# Altium footprint library chipfc_libs.PCBLIB: 391 footprints (part 23 of 25)
Each footprint in its own frame and in the unit in brackets; x right, y up, seen from the top. Pads: shape width x height; smd on the part's side, far side on the other; paste and mask are expansions set on the pad; w line width, h text height; cw(c..) or ccw(c..) is an arc to the next point about the centre after c.
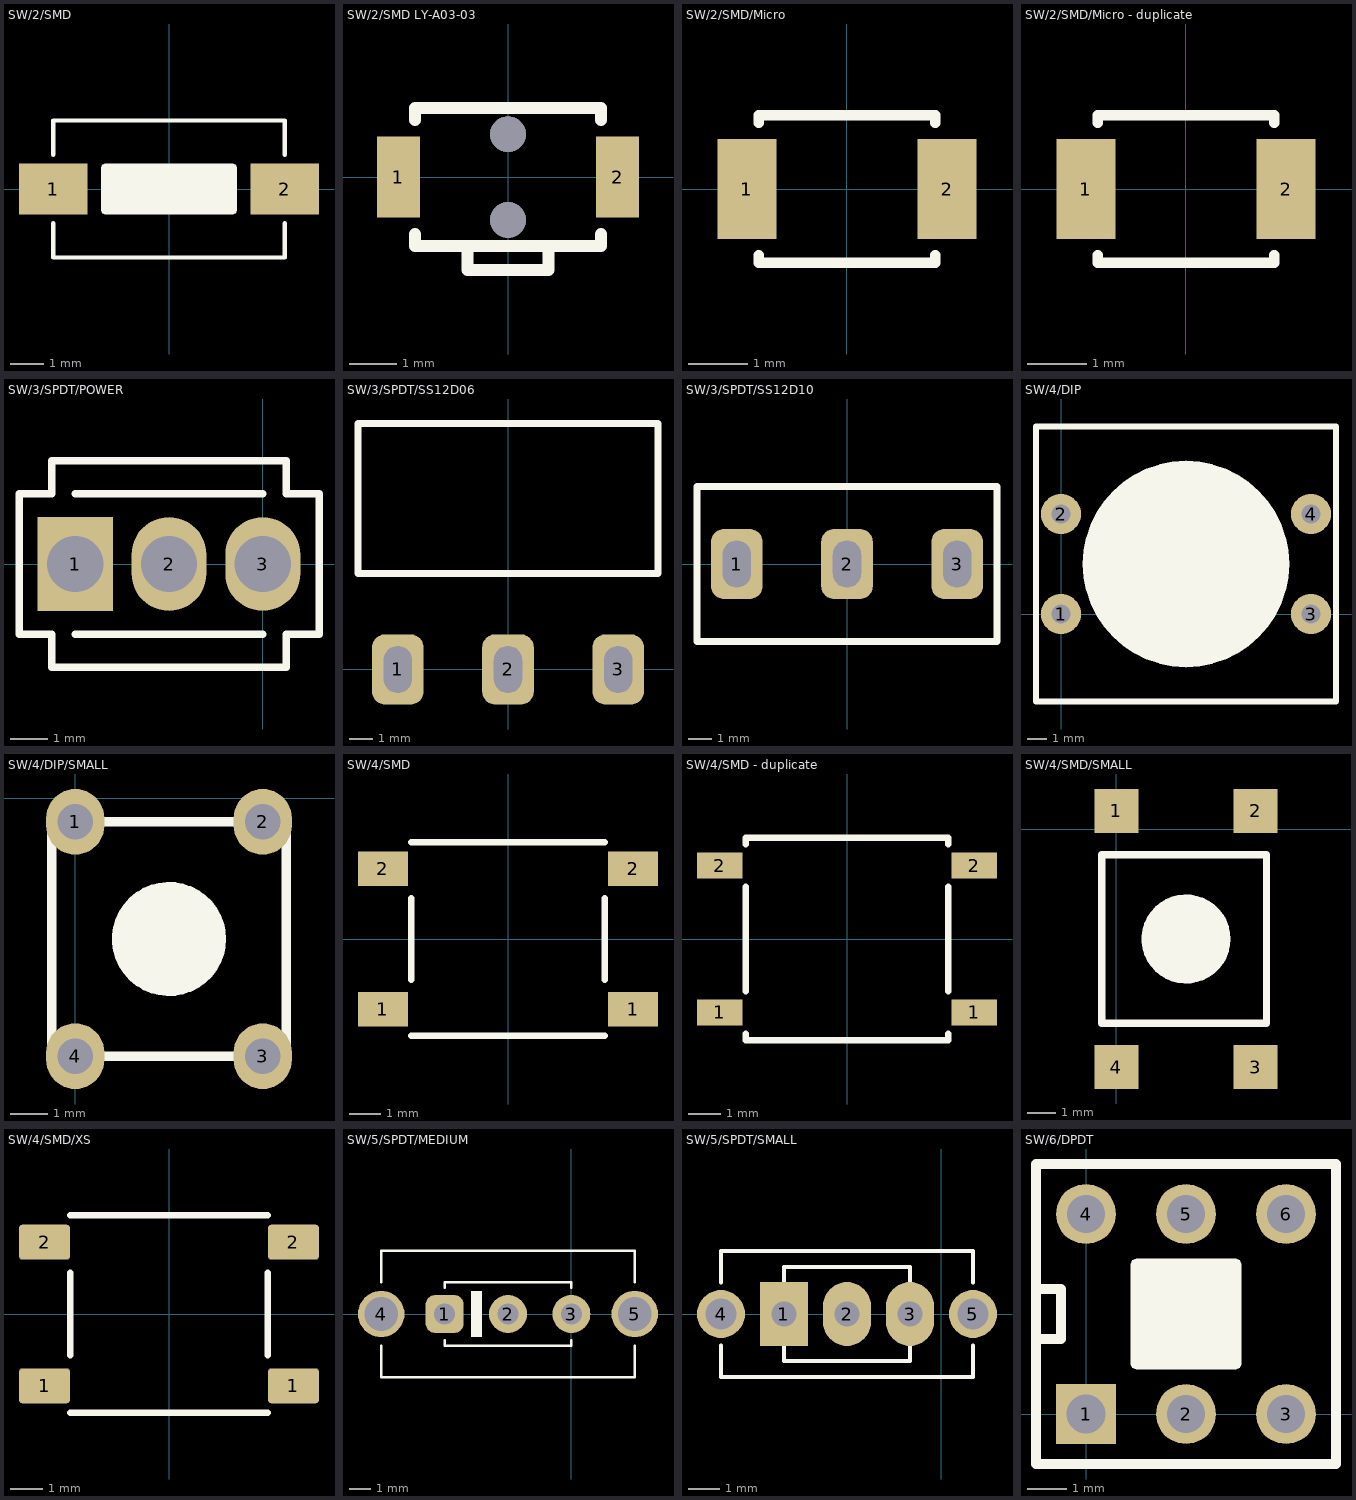
[diagram p22: the footprints below, top view; thin cyan lines are the x and y axes]

## SW/2/SMD [mil]
pads (2):
  rect 80x60 smd: 1(-135,0) 2(135,0)
Top Overlay:
  region: 78.06,28.06 79.33,25 79.33,-25 78.06,-28.06 75,-29.33 -75,-29.33 -78.06,-28.06 -79.33,-25 -79.33,25 -78.06,28.06 -75,29.33 75,29.33
  lines w5: -135,-40 -135,-80 135,-80 135,-40 ; -135,40 -135,80 135,80 135,40
3D body "User Library-TVBU19.step": height 98.43, standoff 0, extent -120,-72.83 120.16,72.83

## SW/2/SMD LY-A03-03 [mm]
pads (4):
  rect 0.9x1.7 smd: 1(-2.3,0) 2(2.3,0)
  round 0.75 hole 0.75: ""(0,-0.9) ""(0,0.9)
Top Overlay:
  lines w0.254: -1.95,-1.2 -1.95,-1.45 1.95,-1.45 1.95,-1.2 ; -1.95,1.2 -1.95,1.45 1.95,1.45 1.95,1.2 ; -0.85,-1.45 -0.85,-1.95 0.85,-1.95 0.85,-1.45

## SW/2/SMD/Micro [mm]
pads (2):
  rect 1x1.7 smd: 1(-1.7,0) 2(1.7,0)
Top Overlay:
  lines w0.178: -1.5,-1.125 -1.5,-1.25 1.5,-1.25 1.5,-1.125 ; -1.5,1.125 -1.5,1.25 1.5,1.25 1.5,1.125
3D body: height 1.6, standoff 0, extent -0.744,-0.748 0.75,0.749
3D body: height 1.2, standoff 0, extent -1.5,-1.25 1.5,1.25

## SW/2/SMD/Micro - duplicate [mm]
pads (2):
  rect 1x1.7 smd: 1(-1.7,0) 2(1.7,0)
Top Overlay:
  lines w0.178: -1.5,-1.125 -1.5,-1.25 1.5,-1.25 1.5,-1.125 ; -1.5,1.125 -1.5,1.25 1.5,1.25 1.5,1.125
3D body: height 1.6, standoff 0, extent -0.744,-0.748 0.75,0.749
3D body: height 1.2, standoff 0, extent -1.5,-1.25 1.5,1.25

## SW/3/SPDT/POWER [mil]
pads (3):
  rect 80x100 hole 60: 1(-200,0)
  oval 80x100 hole 60: 2(-100,0) 3(0,0)
Top Overlay:
  lines w8: -200,-75 0,-75 ; -200,75 0,75 ; -260,-75 -225,-75 -225,-110 25,-110 25,-75 60,-75 60,75 25,75 25,110 -225,110 -225,75 -260,75 -260,-75

## SW/3/SPDT/SS12D06 [mm]
pads (3):
  rrect50% 2.2x3 hole 1.2 slot 2 at 90 deg: 1(-4.7,0) 2(0,0) 3(4.7,0)
Top Overlay:
  lines w0.3: -6.4,4.1 6.4,4.1 6.4,10.5 -6.4,10.5 -6.4,4.1
3D body "ss-12d06l5r.stp": height 6.6, standoff -2.55, extent -6.475,-0.6 6.475,15.5

## SW/3/SPDT/SS12D10 [mm]
pads (3):
  rrect50% 2.2x3 hole 1.2 slot 2 at 90 deg: 1(-4.7,0) 2(0,0) 3(4.7,0)
Top Overlay:
  lines w0.3: -6.4,-3.3 6.4,-3.3 6.4,3.3 -6.4,3.3 -6.4,-3.3
3D body "41893.stp": height 12.5, standoff -5.4, extent -6.4,-3.3 6.35,3.8

## SW/4/DIP [mil]
pads (4):
  round 80 / inner round 62 / far side round 80 hole 38: 1(0,0) 2(0,200) 3(500,0) 4(500,200)
Top Overlay:
  drawing of 6 lines, arcs and shapes, not listed

## SW/4/DIP/SMALL [mil]
pads (4):
  oval 62x70 / inner round 60 / far side oval 62x70 hole 38: 1(0,-25) 2(200,-25) 3(200,-275) 4(0,-275)
Top Overlay:
  circle w10: c100,-150 r55.9
  region: 114.66,-95 114.73,-95.04 114.8,-95.04 128.4,-100.67 128.45,-100.72 128.52,-100.74 140.2,-109.7 140.24,-109.76 140.3,-109.8 149.26,-121.48 149.28,-121.55 149.33,-121.6 154.96,-135.2 154.96,-135.27 155,-135.34 156.92,-149.93 156.9,-150 156.92,-150.07 155,-164.66 154.96,-164.73 154.96,-164.8 149.33,-178.4 149.28,-178.45 149.26,-178.52 140.3,-190.2 140.24,-190.24 140.2,-190.3 128.52,-199.26 128.45,-199.28 128.4,-199.33 114.8,-204.96 114.73,-204.96 114.66,-205 100.07,-206.92 100,-206.9 99.93,-206.92 85.34,-205 85.27,-204.96 85.2,-204.96 71.6,-199.33 71.55,-199.28 71.48,-199.26 59.8,-190.3 59.76,-190.24 59.7,-190.2 50.74,-178.52 50.72,-178.45 50.67,-178.4 45.04,-164.8 45.04,-164.73 45,-164.66 43.08,-150.07 43.1,-150 43.08,-149.93 45,-135.34 45.04,-135.27 45.04,-135.2 49.37,-124.73 49.39,-124.72 49.39,-124.69 49.53,-124.57 49.67,-124.44 49.68,-124.44 49.77,-124.26 49.75,-124.24 49.75,-124.21 49.73,-124.19 49.75,-124.01 49.75,-123.82 50.67,-121.6 50.72,-121.55 50.74,-121.48 59.7,-109.8 59.76,-109.76 59.8,-109.7 71.48,-100.74 71.55,-100.72 71.6,-100.67 85.2,-95.04 85.27,-95.04 85.34,-95 99.93,-93.08 100,-93.1 100.07,-93.08
  lines w10: -25,-275 225,-275 225,-25 -25,-25 -25,-275

## SW/4/SMD [mm]
pads (4):
  rect 1.6x1.1 smd: 1(-4,-2.25) 1(4,-2.25) 2(-4,2.25) 2(4,2.25)
Top Overlay:
  lines w0.203: -3.1,-3.1 3.1,-3.1 ; -3.1,-1.3 -3.1,1.3 ; -3.1,3.1 3.1,3.1 ; 3.1,-1.3 3.1,1.3
3D body "User Library-PTS645SL70SMTR92-LFS.STEP": height 7, standoff 0, extent -4.5,-3 4.5,3

## SW/4/SMD - duplicate [mm]
pads (4):
  rect 1.4x0.8 smd: 1(-3.9,-2.25) 1(3.9,-2.25) 2(-3.9,2.25) 2(3.9,2.25)
Top Overlay:
  lines w0.203: -3.1,-2.9 -3.1,-3.1 3.1,-3.1 3.1,-2.9 ; -3.1,-1.6 -3.1,1.6 ; -3.1,2.9 -3.1,3.1 3.1,3.1 3.1,2.9 ; 3.1,-1.6 3.1,1.6
3D body "User Library-PTS645SL70SMTR92-LFS.STEP": height 7, standoff 0, extent -4.5,-3 4.5,3

## SW/4/SMD/SMALL [mil]
pads (4):
  rect 60x60 smd: 1(0,25) 2(190,25) 3(190,-325) 4(0,-325)
Top Overlay:
  circle w10: c95,-150 r55.9
  region: 109.66,-95 109.73,-95.04 109.8,-95.04 123.4,-100.67 123.45,-100.72 123.52,-100.74 135.2,-109.7 135.24,-109.76 135.3,-109.8 144.26,-121.48 144.28,-121.55 144.33,-121.6 149.96,-135.2 149.96,-135.27 150,-135.34 151.92,-149.93 151.9,-150 151.92,-150.07 150,-164.66 149.96,-164.73 149.96,-164.8 144.33,-178.4 144.28,-178.45 144.26,-178.52 135.3,-190.2 135.24,-190.24 135.2,-190.3 123.52,-199.26 123.45,-199.28 123.4,-199.33 109.8,-204.96 109.73,-204.96 109.66,-205 95.07,-206.92 95,-206.9 94.93,-206.92 80.34,-205 80.27,-204.96 80.2,-204.96 66.6,-199.33 66.55,-199.28 66.48,-199.26 54.8,-190.3 54.76,-190.24 54.7,-190.2 45.74,-178.52 45.72,-178.45 45.67,-178.4 40.04,-164.8 40.04,-164.73 40,-164.66 38.08,-150.07 38.1,-150 38.08,-149.93 40,-135.34 40.04,-135.27 40.04,-135.2 44.37,-124.73 44.39,-124.72 44.39,-124.69 44.53,-124.57 44.67,-124.44 44.68,-124.44 44.77,-124.26 44.75,-124.24 44.75,-124.21 44.73,-124.19 44.75,-124.01 44.75,-123.82 45.67,-121.6 45.72,-121.55 45.74,-121.48 54.7,-109.8 54.76,-109.76 54.8,-109.7 66.48,-100.74 66.55,-100.72 66.6,-100.67 80.2,-95.04 80.27,-95.04 80.34,-95 94.93,-93.08 95,-93.1 95.07,-93.08
  lines w10: -20,-265 205,-265 205,-35 -20,-35 -20,-265

## SW/4/SMD/XS [mm]
pads (4):
  rrect20% 1.6x1.1 smd: 1(-3.9,-2.25) 1(3.9,-2.25) 2(-3.9,2.25) 2(3.9,2.25)
Top Overlay:
  lines w0.203: -3.1,-3.1 3.1,-3.1 ; -3.1,-1.3 -3.1,1.3 ; -3.1,3.1 3.1,3.1 ; 3.1,-1.3 3.1,1.3
3D body "User Library-PTS645SL70SMTR92-LFS.STEP": height 7, standoff 0, extent -4.5,-3 4.5,3

## SW/5/SPDT/MEDIUM [mm]
pads (5):
  rrect50% 1.8x1.8 hole 1: 1(-6,0)
  round 1.8 hole 1: 2(-3,0) 3(0,0)
  round 2.2 hole 1.6: 4(-9,0) 5(3,0)
Top Overlay:
  region: -4.25,1.069 -4.25,-1.069 -4.75,-1.069 -4.75,1.069
  lines w0.127: -8.999,-1.5 -8.999,-3 3,-3 3,-1.5 ; -8.999,1.5 -8.999,3 3,3 3,1.5 ; -5.999,-1.25 -5.999,-1.5 0,-1.5 0,-1.25 ; -5.999,1.25 -5.999,1.5 0,1.5 0,1.25
3D body: height 6.5, standoff 0, extent -9.25,-3 3.25,3
3D body: height 15, standoff 6.5, extent -6,-1.5 -3,1.5

## SW/5/SPDT/SMALL [mil]
pads (5):
  rect 60x80 / inner round 60 / far side rect 60x80 hole 31: 1(-196.85,0)
  oval 60x80 / inner round 60 / far side oval 60x80 hole 31: 2(-118.1,0) 3(-39.37,0)
  round 60 hole 39: 4(-275.58,0) 5(39.37,0)
Top Overlay:
  lines w5: -275.57,-39.37 -275.57,-78.73 39.37,-78.73 39.37,-39.37 ; -275.57,39.37 -275.57,78.73 39.37,78.73 39.37,39.37 ; -196.83,-39.37 -196.83,-59.05 -39.37,-59.05 -39.37,-39.37 ; -196.83,39.37 -196.83,59.05 -39.37,59.05 -39.37,39.37

## SW/6/DPDT [mil]
pads (6):
  rect 60x60 / inner round 60 / far side rect 60x80 hole 39: 1(0,0)
  round 60 / inner round 60 / far side oval 60x80 hole 38: 2(100,0) 3(200,0) 4(0,200) 5(100,200) 6(200,200)
Top Overlay:
  region: 153.83,153.83 155.41,150 155.41,50 153.83,46.17 150,44.59 50,44.59 46.17,46.17 44.59,50 44.59,150 46.17,153.83 50,155.41 150,155.41
  lines w10: -50,75 -25,75 -25,125 -50,125 ; -50,-50 250,-50 250,250 -50,250 -50,-50